# Altium footprint library arduinoNano.PcbLib: 9 footprints
Each footprint in its own frame and in the unit in brackets; x right, y up, seen from the top. Pads: shape width x height; smd on the part's side, far side on the other; paste and mask are expansions set on the pad; w line width, h text height; cw(c..) or ccw(c..) is an arc to the next point about the centre after c.
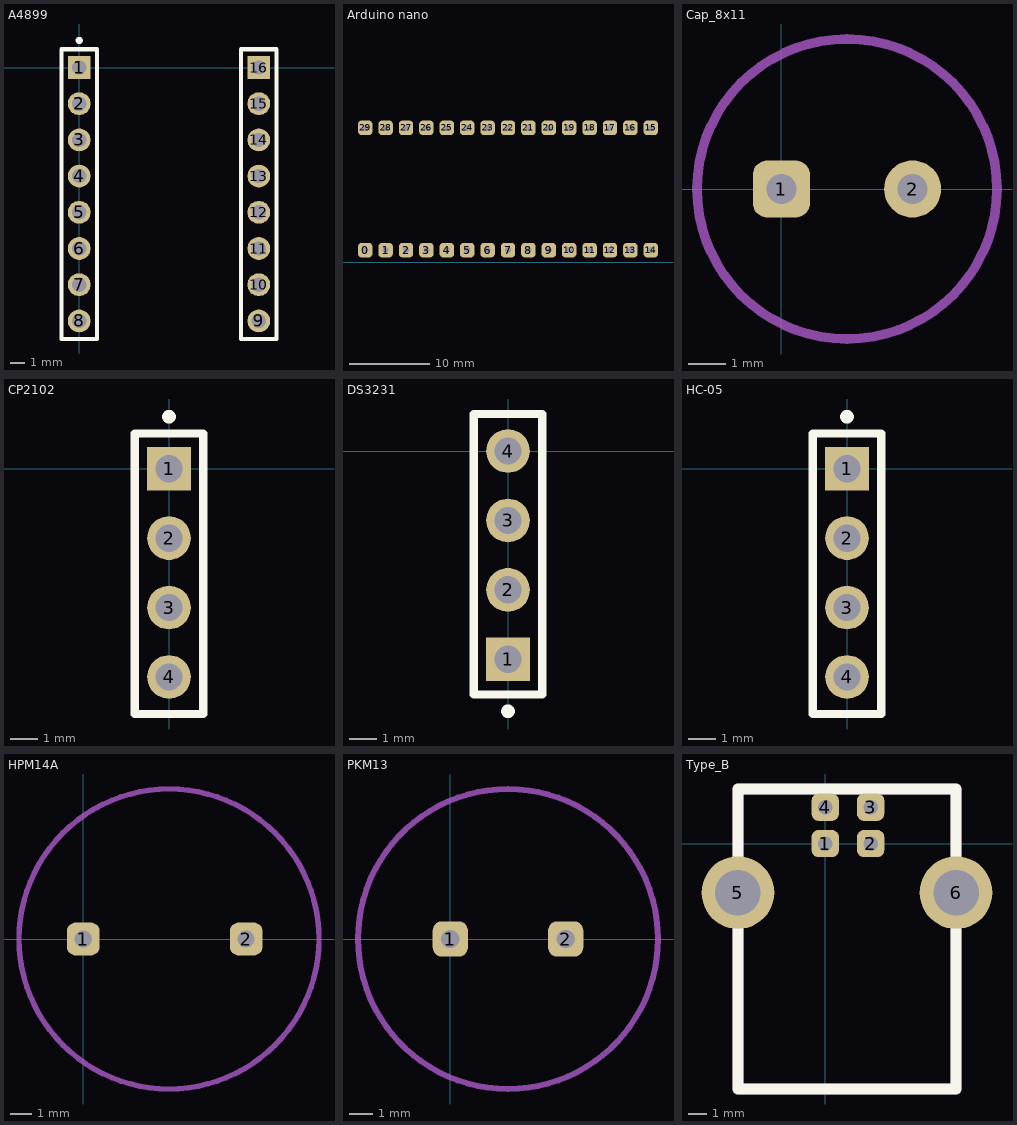
[diagram p0: the footprints below, top view; thin cyan lines are the x and y axes]

## A4899 [mm]
height 8.8
pads (16):
  rect 1.6x1.6 hole 1: 1(0,0) 16(12.6,0)
  round 1.6 hole 1: 2(0,-2.54) 3(0,-5.08) 4(0,-7.62) 5(0,-10.16) 6(0,-12.7) 7(0,-15.24) 8(0,-17.78) 9(12.6,-17.78) 10(12.6,-15.24) 11(12.6,-12.7) 12(12.6,-10.16) 13(12.6,-7.62) 14(12.6,-5.08) 15(12.6,-2.54)
Top Overlay:
  circle w0.3: c0,1.9 r0.1
  lines w0.3: -1.25,-19.05 -1.25,1.29 1.25,1.29 1.25,-19.05 -1.25,-19.05 ; 11.35,-19.05 13.85,-19.05 13.85,1.29 11.35,1.29 11.35,-19.05
Mechanical 1:
  lines w0.2: -1.25,-19.05 1.25,-19.05 1.25,1.29 -1.25,1.29 -1.25,-19.05 ; 11.35,-19.05 11.35,1.29 13.85,1.29 13.85,-19.05 11.35,-19.05
  text "1" at -0.508,0.254 h1.5
  text "8" at -0.635,-17.78 h1.5
  text "9" at 11.965,-17.78 h1.5
  text "16" at 12.092,0.254 h1.5
3D body "DRV 8825 With Headers Assem.STEP": height 9.32, standoff -1.58, extent -1.157,-19.39 13.843,1.61

## Arduino nano [mil] "arduino nano"
height 1700
pads (30):
  rrect50% 70.87x70.87 hole 30: 0(160,60) 1(260,60) 2(360,60) 3(460,60) 4(560,60) 5(660,60) 6(760,60) 7(860,60) 8(960,60) 9(1060,60) 10(1160,60) 11(1260,60) 12(1360,60) 13(1460,60) 14(1560,60) 15(1560,660) 16(1460,660) 17(1360,660) 18(1260,660) 19(1160,660) 20(1060,660) 21(960,660) 22(860,660) 23(760,660) 24(660,660) 25(560,660) 26(460,660) 27(360,660) 28(260,660) 29(160,660)
3D body "User Library-ARDUINO_NANO_V3.STEP": height 594.49, standoff -137.8, extent 9.61,5.68 1781.27,714.34

## Cap_8x11 [mil]
pads (2):
  rrect50% 60x60 hole 31.5: 1(0,0)
  round 60 hole 31.5: 2(137.8,0)
Mechanical 1:
  circle w10: c68.9,0 r157.48
3D body "User Library-Cap electro 8x11_5x3_5mm.step": height 473.44, standoff -136.91, extent -89.58,-157.48 227.38,159.48

## CP2102 [mm]
pads (4):
  rect 1.6x1.6 hole 1: 1(0,0)
  round 1.6 hole 1: 2(0,-2.54) 3(0,-5.08) 4(0,-7.62)
Top Overlay:
  circle w0.3: c0,1.9 r0.1
  lines w0.3: -1.25,-8.975 1.25,-8.975 1.25,1.29 -1.25,1.29 -1.25,-8.975
Mechanical 1:
  lines w0.2: -1.25,-8.95 -1.25,1.29 1.25,1.29 1.25,-8.95 -1.25,-8.95
  text ".Designator" at 1.825,-0.725 h1.5
  text "6" at -0.475,-7.3 h1.5
  text "1" at -0.508,0.254 h1.5
3D body "User Library-1x4 TH Pitch 2_54mm.STEP": height 9.5, standoff -3.2, extent -1.32,-8.9 1.22,1.26
3D body "CP2102-BOARD.STEP": height 9.73, standoff 5.4, extent -19.907,-11.9 1.707,4.1

## DS3231 [mm]
pads (4):
  rect 1.6x1.6 hole 1: 1(0,-7.62)
  round 1.6 hole 1: 2(0,-5.08) 3(0,-2.54) 4(0,0)
Top Overlay:
  circle w0.3: c0,-9.52 r0.1
  lines w0.3: -1.25,-8.91 -1.25,1.355 1.25,1.355 1.25,-8.91 -1.25,-8.91
Mechanical 1:
  lines w0.2: -1.25,-8.91 1.25,-8.91 1.25,1.33 -1.25,1.33 -1.25,-8.91
  text ".Designator" at -1.825,-6.895 h1.5
  text "6" at 0.475,-0.32 h1.5
  text "1" at 0.508,-7.874 h1.5
3D body "User Library-DS3231 Timer Assembly.STEP": height 15.63, standoff -2, extent -37.07,-11.5 1.27,10.3

## HC-05 [mm]
pads (4):
  rect 1.6x1.6 hole 1: 1(0,0)
  round 1.6 hole 1: 2(0,-2.54) 3(0,-5.08) 4(0,-7.62)
Top Overlay:
  circle w0.3: c0,1.9 r0.1
  lines w0.3: -1.25,-8.975 -1.25,1.29 1.25,1.29 1.25,-8.975 -1.25,-8.975
Mechanical 1:
  lines w0.2: -1.25,-8.95 1.25,-8.95 1.25,1.29 -1.25,1.29 -1.25,-8.95
  text "1" at -0.508,0.254 h1.5
  text "6" at -0.475,-7.3 h1.5
  text ".Designator" at 1.825,-0.725 h1.5
3D body "User Library-hc05.step": height 11.9, standoff 6, extent -36.2,-11.85 6.4,4.25
3D body "User Library-1x4 TH Pitch 2_54mm.STEP": height 9.5, standoff -3.2, extent -1.32,-8.9 1.22,1.26

## HPM14A [mil] "Busser"
pads (2):
  rrect50% 60x60 hole 31.5: 1(0,0) 2(299.21,0)
Mechanical 1:
  circle w10: c157.48,0 r275.62

## PKM13 [mil] "Busser"
pads (2):
  rrect50% 60x60 hole 31.5: 1(0,0) 2(196.85,0)
Mechanical 1:
  circle w10: c98.43,0 r255.91
3D body: height 275.59, standoff 0, extent -157.47,-255.9 354.34,255.91

## Type_B [mm]
pads (6):
  rrect50% 1.5x1.5 hole 0.8: 1(0,0) 2(2.5,0) 3(2.5,2) 4(0,2)
  round 4 hole 2.5: 5(-4.8,-2.7) 6(7.2,-2.7)
Top Overlay:
  lines w0.6: -4.8,-13.5 -4.8,3 7.2,3 7.2,-13.5 -4.8,-13.5
Mechanical 1:
  lines w0.6: -4.8,-13.5 7.2,-13.5 7.2,3 -4.8,3 -4.8,-13.5
3D body "43751.stp": height 11.3, standoff -3.05, extent -6.175,-13.1 8.775,3.4